# Altium footprint library 6-Connectors-4.PcbLib: 166 footprints (part 6 of 12)
Each footprint in its own frame and in the unit in brackets; x right, y up, seen from the top. Pads: shape width x height; smd on the part's side, far side on the other; paste and mask are expansions set on the pad; w line width, h text height; cw(c..) or ccw(c..) is an arc to the next point about the centre after c.
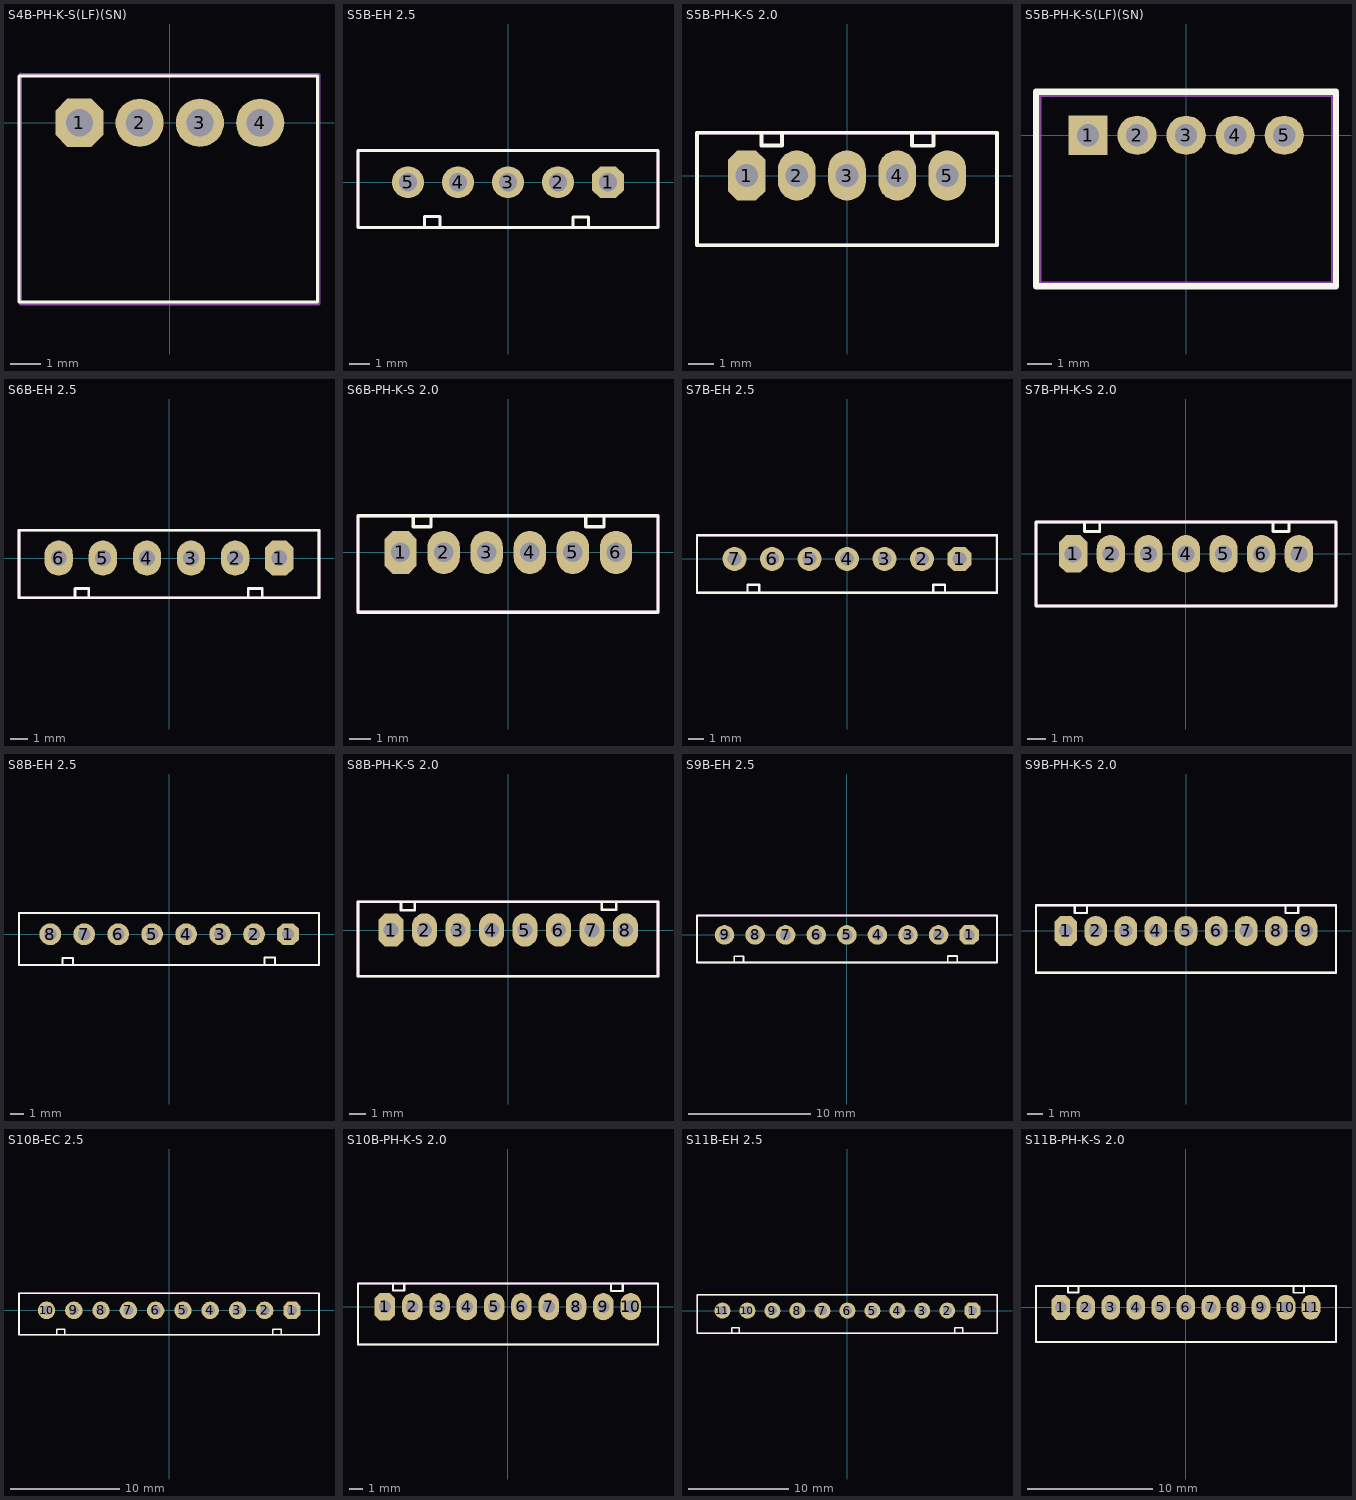
[diagram p5: the footprints below, top view; thin cyan lines are the x and y axes]

## S4B-PH-K-S(LF)(SN) [mm] "820-1507 // JST"
height 3.25
pads (4):
  oct 1.6x1.6 hole 0.9: 1(-3,0)
  round 1.6 hole 0.9 mask+0.07: 2(-1,0) 3(1,0) 4(3,0)
Top Overlay:
  lines w0.1: -5.004,-5.944 -5.004,1.549 4.902,1.549 4.902,-5.944 -5.004,-5.944
Mechanical 15:
  lines w0.1: -4.969,1.6 4.953,1.6 4.953,-6.007 -4.95,-6.007 -4.95,1.613
3D body "m20-20via.stp": height 0.1, standoff -1.85, extent 2.223,-0.825 3.873,0.825
3D body "m20-20via.stp": height 0.1, standoff -1.85, extent 0.191,-0.825 1.841,0.825
3D body "m20-20via.stp": height 0.1, standoff -1.85, extent -1.841,-0.825 -0.191,0.825
3D body "m20-20via.stp": height 0.1, standoff -1.85, extent -3.825,-0.825 -2.175,0.825
3D body "4b-ph-kl-s2_0.stp": height 4.8, standoff -3.34, extent -4.937,-6.01 4.963,1.59
3D body "1_6-1_6-0_6-1_8.stp": height 0.05, standoff -1.75, extent -3.8,-0.8 -2.2,0.8
3D body "1_6-1_6-0_6-1_8.stp": height 0.05, standoff -1.75, extent -1.8,-0.8 -0.2,0.8
3D body "1_6-1_6-0_6-1_8.stp": height 0.05, standoff -1.75, extent 0.2,-0.8 1.8,0.8
3D body "1_6-1_6-0_6-1_8.stp": height 0.05, standoff -1.75, extent 2.2,-0.8 3.8,0.8

## S5B-EH 2.5 [mm]
height 3.25
pads (5):
  oct 1.6x1.6 hole 0.9: 1(5,0)
  round 1.6 hole 0.9 mask+0.07: 2(2.5,0) 3(0,0) 4(-2.5,0) 5(-5,0)
Top Overlay:
  lines w0.15: -4.175,-2.2 -4.175,-1.7 -3.4,-1.7 -3.4,-2.225 ; 3.25,-2.225 3.25,-1.725 4.025,-1.725 4.025,-2.25 ; -7.5,-2.25 7.5,-2.25 7.5,1.575 -7.5,1.575 -7.5,-2.25
Mechanical 14:
  lines w0.15: -7.5,-2.25 7.5,-2.25 7.5,1.575 -7.5,1.575 -7.5,-2.25
Mechanical 15:
  lines w0.15: -7.5,-2.25 7.5,-2.25 7.5,1.575 -7.5,1.575 -7.5,-2.25
3D body "s5b-eh.stp": height 6, standoff -3.2, extent -7.55,-2.25 7.45,1.55

## S5B-PH-K-S 2.0 [mm]
height 3.25
pads (5):
  oct 1.5x2 hole 0.9: 1(-4,0)
  oval 1.5x2 hole 0.9: 2(-2,0) 3(0,0) 4(2,0) 5(4,0)
Top Overlay:
  lines w0.152: -3.405,1.68 -3.405,1.19 -2.585,1.19 -2.585,1.67 ; 2.595,1.675 2.595,1.185 3.445,1.185 3.445,1.665 ; -5.975,-2.775 5.975,-2.775 5.975,1.7 -5.975,1.7 -5.975,-2.775
Mechanical 11:
  lines w0.152: -5.975,-2.775 5.975,-2.775 5.975,1.7 -5.975,1.7 -5.975,-2.775
Mechanical 14:
  lines w0.152: -5.975,-2.775 5.975,-2.775 5.975,1.7 -5.975,1.7 -5.975,-2.775
3D body "s5b-ph-k-s.stp": height 6, standoff -3.4, extent -5.95,-2.8 5.95,1.7

## S5B-PH-K-S(LF)(SN) [mm] "820-1501 // JST"
height 3.25
pads (5):
  rect 1.6x1.6 hole 0.9: 1(-4,0)
  round 1.6 hole 0.9 mask+0.07: 2(-2,0) 3(0,0) 4(2,0) 5(4,0)
Top Overlay:
  lines w0.254: -6.121,-6.159 6.109,-6.159 6.109,1.778 -6.121,1.778 -6.121,-6.159
Mechanical 15:
  lines w0.1: -5.969,1.6 5.95,1.6 ; -5.95,1.613 -5.95,-6.007 5.95,-6.007 5.95,1.587
3D body "5b-ph-kls-2_0.stp": height 4.85, standoff -3.35, extent -5.899,-6.01 6.001,1.59

## S6B-EH 2.5 [mm]
height 3.25
pads (6):
  oct 1.6x2 hole 0.9: 1(6.25,0)
  oval 1.6x2 hole 0.9 mask+0.07: 2(3.75,0) 3(1.25,0) 4(-1.25,0) 5(-3.75,0) 6(-6.25,0)
Top Overlay:
  lines w0.15: -5.325,-2.225 -5.325,-1.725 -4.55,-1.725 -4.55,-2.25 ; 4.5,-2.225 4.5,-1.725 5.275,-1.725 5.275,-2.25 ; -8.5,-2.25 -8.5,1.575 8.5,1.575 8.5,-2.25 -8.5,-2.25
Mechanical 14:
  lines w0.15: -8.5,-2.25 -8.5,1.575 8.5,1.575 8.5,-2.25 -8.5,-2.25
Mechanical 15:
  lines w0.15: -8.5,-2.25 -8.5,1.575 8.5,1.575 8.5,-2.25 -8.5,-2.25
3D body "s6b-eh.stp": height 6, standoff -3.2, extent -8.5,-2.2 8.5,1.6

## S6B-PH-K-S 2.0 [mm]
height 3.25
pads (6):
  oct 1.5x2 hole 0.9: 1(-5,0)
  oval 1.5x2 hole 0.9: 2(-3,0) 3(-1,0) 4(1,0) 5(3,0) 6(5,0)
Top Overlay:
  lines w0.152: -4.405,1.68 -4.405,1.19 -3.585,1.19 -3.585,1.67 ; 3.595,1.675 3.595,1.185 4.445,1.185 4.445,1.665 ; -6.975,-2.775 -6.975,1.7 6.95,1.7 6.95,-2.775 -6.975,-2.775
Mechanical 11:
  lines w0.152: -6.975,-2.775 -6.975,1.7 6.95,1.7 6.95,-2.775 -6.975,-2.775
Mechanical 14:
  lines w0.152: -6.975,-2.775 -6.975,1.7 6.95,1.7 6.95,-2.775 -6.975,-2.775
3D body "s6b-ph-k-s.stp": height 6, standoff -3.3, extent -6.95,-2.825 6.95,1.675

## S7B-EH 2.5 [mm]
height 3.25
pads (7):
  oct 1.6x1.6 hole 0.9: 1(7.5,0)
  round 1.6 hole 0.9 mask+0.07: 2(5,0) 3(2.5,0) 4(0,0) 5(-2.5,0) 6(-5,0) 7(-7.5,0)
Top Overlay:
  lines w0.15: -6.625,-2.225 -6.625,-1.725 -5.85,-1.725 -5.85,-2.25 ; 5.75,-2.225 5.75,-1.725 6.525,-1.725 6.525,-2.25 ; -10,-2.25 -10,1.575 10,1.575 10,-2.25 -10,-2.25
Mechanical 14:
  lines w0.15: -10,-2.25 -10,1.575 9.975,1.575 9.975,-2.25 -10,-2.25
Mechanical 15:
  lines w0.15: -10,-2.25 -10,1.575 10,1.575 10,-2.25 -10,-2.25
3D body "s7b-eh.stp": height 6, standoff -3.2, extent -10,-2.225 10,1.575

## S7B-PH-K-S 2.0 [mm]
height 3.25
pads (7):
  oct 1.5x2 hole 0.9: 1(-6,0)
  oval 1.5x2 hole 0.9: 2(-4,0) 3(-2,0) 4(0,0) 5(2,0) 6(4,0) 7(6,0)
Top Overlay:
  lines w0.152: -5.405,1.68 -5.405,1.19 -4.585,1.19 -4.585,1.67 ; 4.62,1.675 4.62,1.185 5.47,1.185 5.47,1.665 ; -7.975,-2.775 7.975,-2.775 7.975,1.7 -7.975,1.7 -7.975,-2.775
Mechanical 11:
  lines w0.152: -7.975,-2.775 7.975,-2.775 7.975,1.7 -7.975,1.7 -7.975,-2.775
Mechanical 14:
  lines w0.152: -7.975,-2.775 7.975,-2.775 7.975,1.7 -7.975,1.7 -7.975,-2.775
3D body "s7b-ph-k-s.stp": height 6, standoff -3.4, extent -7.95,-2.85 7.95,1.65

## S8B-EH 2.5 [mm]
height 3.25
pads (8):
  oct 1.6x1.6 hole 0.9: 1(8.75,0)
  round 1.6 hole 0.9 mask+0.07: 2(6.25,0) 3(3.75,0) 4(1.25,0) 5(-1.25,0) 6(-3.75,0) 7(-6.25,0) 8(-8.75,0)
Top Overlay:
  lines w0.15: -7.85,-2.25 -7.85,-1.75 -7.075,-1.75 -7.075,-2.275 ; 7,-2.225 7,-1.725 7.775,-1.725 7.775,-2.25 ; -11.05,-2.25 -11.05,1.575 11.025,1.575 11.025,-2.25 -11.05,-2.25
Mechanical 14:
  lines w0.15: -11.05,-2.25 -11.05,1.575 11.025,1.575 11.025,-2.25 -11.05,-2.25
Mechanical 15:
  lines w0.15: -11.05,-2.25 -11.05,1.575 11.025,1.575 11.025,-2.25 -11.05,-2.25
3D body "s8b-eh.stp": height 6, standoff -3.2, extent -11,-2.175 11,1.625

## S8B-PH-K-S 2.0 [mm]
height 3.25
pads (8):
  oct 1.5x2 hole 0.9: 1(-7,0)
  oval 1.5x2 hole 0.9: 2(-5,0) 3(-3,0) 4(-1,0) 5(1,0) 6(3,0) 7(5,0) 8(7,0)
Top Overlay:
  lines w0.152: -6.405,1.68 -6.405,1.19 -5.585,1.19 -5.585,1.67 ; 5.595,1.7 5.595,1.21 6.445,1.21 6.445,1.69 ; -8.975,-2.775 8.95,-2.775 8.95,1.7 -8.975,1.7 -8.975,-2.775
Mechanical 11:
  lines w0.152: -8.975,-2.775 8.95,-2.775 8.95,1.7 -8.975,1.7 -8.975,-2.775
Mechanical 14:
  lines w0.152: -8.975,-2.775 8.95,-2.775 8.95,1.7 -8.975,1.7 -8.975,-2.775
3D body "s8b-ph-k-s.stp": height 6, standoff -3.3, extent -8.975,-2.8 8.925,1.7

## S9B-EH 2.5 [mm]
height 3.25
pads (9):
  oct 1.6x1.6 hole 0.9: 1(10,0)
  round 1.6 hole 0.9 mask+0.07: 2(7.5,0) 3(5,0) 4(2.5,0) 5(0,0) 6(-2.5,0) 7(-5,0) 8(-7.5,0) 9(-10,0)
Top Overlay:
  lines w0.15: -9.2,-2.25 -9.2,-1.75 -8.45,-1.75 -8.45,-2.225 ; 8.25,-2.225 8.25,-1.725 9.025,-1.725 9.025,-2.25 ; -12.25,-2.25 12.275,-2.25 12.275,1.575 -12.25,1.575 -12.25,-2.25
Mechanical 14:
  lines w0.15: -12.25,-2.25 12.275,-2.25 12.275,1.575 -12.25,1.575 -12.25,-2.25
Mechanical 15:
  lines w0.15: -12.25,-2.25 12.275,-2.25 12.275,1.575 -12.25,1.575 -12.25,-2.25
3D body "s9b-eh.stp": height 6, standoff -3.2, extent -12.25,-2.175 12.25,1.625

## S9B-PH-K-S 2.0 [mm]
height 3.25
pads (9):
  oct 1.5x2 hole 0.9: 1(-8,0)
  oval 1.5x2 hole 0.9: 2(-6,0) 3(-4,0) 4(-2,0) 5(0,0) 6(2,0) 7(4,0) 8(6,0) 9(8,0)
Top Overlay:
  lines w0.152: -7.405,1.68 -7.405,1.19 -6.585,1.19 -6.585,1.67 ; 6.62,1.675 6.62,1.185 7.47,1.185 7.47,1.665 ; -9.975,-2.775 -9.975,1.7 9.975,1.7 9.975,-2.775 -9.975,-2.775
Mechanical 11:
  lines w0.152: -9.975,-2.775 -9.975,1.7 9.975,1.7 9.975,-2.775 -9.975,-2.775
Mechanical 14:
  lines w0.152: -9.975,-2.775 -9.975,1.7 9.975,1.7 9.975,-2.775 -9.975,-2.775
3D body "s9b-ph-k-s.stp": height 6, standoff -3.4, extent -9.95,-2.825 9.95,1.675

## S10B-EC 2.5 [mm]
height 3.25
pads (10):
  oct 1.6x1.6 hole 0.9: 1(11.25,0)
  round 1.6 hole 0.9 mask+0.07: 2(8.75,0) 3(6.25,0) 4(3.75,0) 5(1.25,0) 6(-1.25,0) 7(-3.75,0) 8(-6.25,0) 9(-8.75,0) 10(-11.25,0)
Top Overlay:
  lines w0.15: -10.325,-2.225 -10.325,-1.725 -9.575,-1.725 -9.575,-2.2 ; 9.5,-2.225 9.5,-1.725 10.275,-1.725 10.275,-2.25 ; -13.775,-2.25 13.725,-2.25 13.725,1.575 -13.775,1.575 -13.775,-2.25
Mechanical 14:
  lines w0.15: -13.775,-2.25 13.725,-2.25 13.725,1.575 -13.775,1.575 -13.775,-2.25
Mechanical 15:
  lines w0.15: -13.775,-2.25 13.725,-2.25 13.725,1.575 -13.775,1.575 -13.775,-2.25
3D body "s10b-eh.stp": height 6, standoff -3.2, extent -13.775,-2.225 13.725,1.575

## S10B-PH-K-S 2.0 [mm]
height 3.25
pads (10):
  oct 1.5x2 hole 0.9: 1(-9,0)
  oval 1.5x2 hole 0.9: 2(-7,0) 3(-5,0) 4(-3,0) 5(-1,0) 6(1,0) 7(3,0) 8(5,0) 9(7,0) 10(9,0)
Top Overlay:
  lines w0.152: -8.405,1.68 -8.405,1.19 -7.585,1.19 -7.585,1.67 ; 7.57,1.65 7.57,1.16 8.42,1.16 8.42,1.64 ; -10.975,-2.775 11,-2.775 11,1.7 -10.975,1.7 -10.975,-2.775
Mechanical 11:
  lines w0.152: -10.975,-2.775 11,-2.775 11,1.7 -10.975,1.7 -10.975,-2.775
Mechanical 14:
  lines w0.152: -10.975,-2.775 11,-2.775 11,1.7 -10.975,1.7 -10.975,-2.775
3D body "s10b-ph-k-s.stp": height 6, standoff -3.3, extent -10.95,-2.85 10.95,1.65

## S11B-EH 2.5 [mm]
height 3.25
pads (11):
  oct 1.6x1.6 hole 0.9: 1(12.5,0)
  round 1.6 hole 0.9 mask+0.07: 2(10,0) 3(7.5,0) 4(5,0) 5(2.5,0) 6(0,0) 7(-2.5,0) 8(-5,0) 9(-7.5,0) 10(-10,0) 11(-12.5,0)
Top Overlay:
  lines w0.15: -11.575,-2.225 -11.575,-1.725 -10.825,-1.725 -10.825,-2.2 ; 10.75,-2.225 10.75,-1.725 11.525,-1.725 11.525,-2.25 ; -15.05,-2.25 14.975,-2.25 14.975,1.575 -15.05,1.575 -15.05,-2.25
Mechanical 14:
  lines w0.15: -15.05,-2.25 14.975,-2.25 14.975,1.575 -15.05,1.575 -15.05,-2.25
Mechanical 15:
  lines w0.15: -15.05,-2.25 14.975,-2.25 14.975,1.575 -15.05,1.575 -15.05,-2.25
3D body "s11b-eh.stp": height 6, standoff -3.2, extent -15.05,-2.25 14.95,1.55

## S11B-PH-K-S 2.0 [mm]
height 3.25
pads (11):
  oct 1.5x2 hole 0.9: 1(-10,0)
  oval 1.5x2 hole 0.9: 2(-8,0) 3(-6,0) 4(-4,0) 5(-2,0) 6(0,0) 7(2,0) 8(4,0) 9(6,0) 10(8,0) 11(10,0)
Top Overlay:
  lines w0.152: -9.405,1.68 -9.405,1.19 -8.585,1.19 -8.585,1.67 ; 8.595,1.65 8.595,1.16 9.445,1.16 9.445,1.64 ; -11.975,-2.775 -11.975,1.7 12,1.7 12,-2.775 -11.975,-2.775
Mechanical 11:
  lines w0.152: -11.975,-2.775 -11.975,1.7 12,1.7 12,-2.775 -11.975,-2.775
Mechanical 14:
  lines w0.152: -11.975,-2.775 -11.975,1.7 12,1.7 12,-2.775 -11.975,-2.775
3D body "s11b-ph-k-s.stp": height 6, standoff -3.4, extent -11.925,-2.8 11.975,1.7